# Altium schematic symbol library Schlib.SchLib: 725 symbols (part 4 of 6) (continued)
## MS561101BA03-50
designator U?  (value not drawn)
Pressure Sensor 1.44V to 3.6V 0.01bar to 1.2bar Absolute 8-Pin QFN T/R; Manufacturer: TE Connectivity; Manufacturer Part Number: MS561101BA03-50; Supplier: Rs; Supplier Part Number: 2006121; RoHS: Yes; Category: Pressure Sensors; Stock: 1767; Pricing: 1=7.8, 50=5.05, 100=4.79, 250=4.67, 1000=4.55 (GBP); ComponentLink1URL: http://www.farnell.com/datasheets/2917208.pdf?src-supplier=Farnell; ComponentLink1Description: http://www.farnell.com/datasheets/2917208.pdf?src-supplier=Farnell; ComponentLink2URL: https://datasheet.octopart.com/MS561101BA03-50-TE-Connectivity-datasheet-21074432.pdf?src-supplier=Element14; ComponentLink2Description: https://datasheet.octopart.com/MS561101BA03-50-TE-Connectivity-datasheet-21074432.pdf?src-supplier=Element14; ComponentLink3URL: http://www.farnell.com/datasheets/1756128.pdf?src-supplier=Newark; ComponentLink3Description: http://www.farnell.com/datasheets/1756128.pdf?src-supplier=Newark; ComponentLink4URL: https://www.te.com/commerce/DocumentDelivery/DDEController?Action=srchrtrv&DocNm=MS5611-01BA03&DocType=Data+Sheet&DocLang=English&src-supplier=Digi-Key; ComponentLink4Description: https://www.te.com/commerce/DocumentDelivery/DDEController?Action=srchrtrv&DocNm=MS5611-01BA03&DocType=Data+Sheet&DocLang=English&src-supplier=Digi-Key; ComponentLink5URL: https://datasheet.octopart.com/MS561101BA03-50-TE-Connectivity-datasheet-65793092.pdf?src-supplier=Future+Electronics; ComponentLink5Description: https://datasheet.octopart.com/MS561101BA03-50-TE-Connectivity-datasheet-65793092.pdf?src-supplier=Future+Electronics; ComponentLink6URL: https://datasheet.octopart.com/MS561101BA03-50-TE-Connectivity-datasheet-134530980.pdf?src-supplier=Master+Electronics; ComponentLink6Description: https://datasheet.octopart.com/MS561101BA03-50-TE-Connectivity-datasheet-134530980.pdf?src-supplier=Master+Electronics
footprint MS561101BA03-50
pins: 1 VDD, 2 PS, 3 GND, 4 ~{CSB}, 5 ~{CSB}, 6 SDO, 7 SDI/SDA, 8 SCLK

## MSMP20A-M3/89A
designator D?  (value not drawn)
MSMP Series 0.5 W 24.5 V Uni-Directional Surface Mount TVS Diode - MICRO SMD-2; Manufacturer: Vishay Semiconductors; Manufacturer Part Number: MSMP20A-M3/89A; Number of Unidirectional Channels: 1; Reverse Standoff Voltage: 20V; Min Breakdown Voltage: 22.2V; Clamping Voltage: 32.4V; Peak Pulse Power: 150W; Power Line Protection: No; Peak Pulse Current: 4.6A; Supplier: Digi-Key; Supplier Part Number: MSMP20A-M3/89AGICT-ND; RoHS: Yes; Category: TVS Diodes; Stock: 299775; Pricing: 1=0.37000, 10=0.30200, 100=0.16010, 500=0.10534, 1000=0.07163, 2000=0.06461 (USD); Mounting Technology: Surface Mount; Min Operating Temperature: -55°C; Max Operating Temperature: 150°C; Packaging: Tape and Reel; Resistor Type: Zener; RoHS Compliant: Yes; ComponentLink1URL: http://www.vishay.com/docs/89457/mspm6a.pdf?src-supplier=Digi-Key; ComponentLink1Description: http://www.vishay.com/docs/89457/mspm6a.pdf?src-supplier=Digi-Key
pins: 1, 2

## MSP5.0A-M3/89A
designator D?  (value not drawn)
TVS DIODE 5VWM 13.4VC MICROSMP; Manufacturer: Vishay Semiconductors; Manufacturer Part Number: MSP5.0A-M3/89A; Max Surge Current: 57A; Max Reverse Leakage Current: 100uA; Element Configuration: Single; Direction: Unidirectional; Operating Supply Voltage: 5V; Number of Elements: 1; Reverse Breakdown Voltage: 6.4V; Breakdown Voltage: 7.07V; Clamping Voltage: 14.5V; Peak Pulse Power: 150W; Power Line Protection: No; Test Current: 1mA; Power Dissipation: 100W; ESD Protection: Yes; Peak Pulse Current: 75A; Diode Type: ZENER; Clamping Voltage-Max: 9.2V; Supplier: Digi-Key; Supplier Part Number: MSP5.0A-M3/89AGICT-ND; RoHS: Yes; Category: TVS Diodes; Stock: 310138; Pricing: 1=0.40000, 10=0.33000, 100=0.17520, 500=0.11528, 1000=0.07839, 2000=0.07070 (USD); Mounting Technology: Surface Mount; Pins: 2; Min Operating Temperature: -55°C; Max Operating Temperature: 150°C; Packaging: Tape and Reel; Package Quantity: 1; Series: TransZorb®, eSMP®; Termination: SMD/SMT; Number of Channels: 1; Polarity: Unidirectional; Number of Unidirectional Channels: 1; Reverse Standoff Voltage: 5V; Min Breakdown Voltage: 6.4V; Max Breakdown Voltage: 7.07V; Leakage Current: 100uA; Resistor Type: Zener; Length: 2.3mm; Width: 1.4mm; Height: 0.73mm; Radiation Hardening: No; Lead Free: Lead Free; RoHS Compliant: Yes; ComponentLink1URL: https://datasheet.ciiva.com/3023/msp3v3-3023073.pdf?src-supplier=Avnet; ComponentLink1Description: https://datasheet.ciiva.com/3023/msp3v3-3023073.pdf?src-supplier=Avnet; ComponentLink2URL: https://datasheet.ciiva.com/17019/0900766b80ed1e45-17019980.pdf?src-supplier=Allied+Electronics; ComponentLink2Description: https://datasheet.ciiva.com/17019/0900766b80ed1e45-17019980.pdf?src-supplier=Allied+Electronics; ComponentLink3URL: https://datasheet.ciiva.com/16464/msp3v3-16464165.pdf?src-supplier=Future+Electronics; ComponentLink3Description: https://datasheet.ciiva.com/16464/msp3v3-16464165.pdf?src-supplier=Future+Electronics; ComponentLink4URL: https://datasheet.ciiva.com/330/msp5-0a-330478.pdf?src-supplier=Digi-Key; ComponentLink4Description: https://datasheet.ciiva.com/330/msp5-0a-330478.pdf?src-supplier=Digi-Key; ComponentLink5URL: https://datasheet.ciiva.com/330/msp5-0a-330479.pdf?src-supplier=Digi-Key; ComponentLink5Description: https://datasheet.ciiva.com/330/msp5-0a-330479.pdf?src-supplier=Digi-Key; ComponentLink6URL: https://datasheet.ciiva.com/330/msp5-0a-330477.pdf?src-supplier=Digi-Key; ComponentLink6Description: https://datasheet.ciiva.com/330/msp5-0a-330477.pdf?src-supplier=Digi-Key
footprint microSMP DO-219AD
pins: 1 C, 2 A

## MSS1P4-M3/89A
designator D?  (value not drawn)
Rectifier Diode, Schottky, 1 Phase, 1 Element, 1A, 40V V(RRM), Silicon, DO-219AD; Manufacturer: Vishay Semiconductors; Manufacturer Part Number: MSS1P4-M3/89A; Max Surge Current: 25A; Max Reverse Current: 200uA; Forward Voltage: 550mV; Supplier: Rs; Supplier Part Number: 7103068; RoHS: No; Category: Rectifier Diodes; Stock: 24825; Pricing: 25=0.097, 250=0.058, 1250=0.053, 2500=0.052, 6250=0.05 (EUR); Mounting Technology: Surface Mount; Pins: 2; Min Operating Temperature: -55°C; Max Operating Temperature: 150°C; Forward Current: 1A; Packaging: Tape and Reel; Package Quantity: 4500; Average Rectified Current: 1A; Max Reverse Leakage Current: 200uA; Max Repetitive Reverse Voltage (Vrrm): 40V; Max Forward Surge Current (Ifsm): 25A; Peak Non-Repetitive Surge Current: 25A; Termination: SMD/SMT; Max Reverse Voltage (DC): 40V; Series: eSMP®; Length: 0.09inch; Width: 1.4mm; Height: 0.018inch; Radiation Hardening: No; Lead Free: Lead Free; Reach SVHC Compliant: Unknown; ComponentLink1URL: https://datasheet.ciiva.com/22685/370198-22685680.pdf?src-supplier=Element14; ComponentLink1Description: https://datasheet.ciiva.com/22685/370198-22685680.pdf?src-supplier=Element14
footprint DO-219AD
pins: 1 C, 2 A

## MU00525-32.768K
designator Y?  (value not drawn)
Manufacturer: NDK; Manufacturer Part Number: MU00525-32.768K; Supplier: Digikey; RoHS: No; Stock: 132326; Pricing: 1=0.72, 10=0.601, 50=0.5408, 100=0.4808, 500=0.45672, 1000=0.38461 (USD); Supplier Part Number: 644-MU00525-32.768KCT-ND
pins: 1 OSC1, 2 OSC2

## NC16356SZ
designator Screws?  (value not drawn)
Manufacturer: Keystone Electronics; Manufacturer Part Number: NC16356SZ; Supplier: Mouser; Supplier Part Number: 534-NC16356SZ; RoHS: No; Stock: 5601; Pricing: 1=0.6, 10=0.514, 50=0.514, 100=0.439, 1000=0.362, 10000=0.311 (USD)
text: M1.6,  L-6mm

## NEO-6M-GPS
designator U?
GPS Development Tools SparkFun GNSS-RTK Dead Reckoning Breakout - ZED-F9K (Qwiic); Manufacturer Part Number: NEO-6M-GPS
footprint NEO-6
footprint RFD900
pins: 2 SS_N (in), 3 TIMEPULSE (out), 4 EXTINT0 (in), 5 USB_DM (io), 6 USB_DP (io), 7 VDDUSB (power), 8 RSVD_8, 9 VCC_RF (out), 10 GND (power), 11 RF_IN (in), 12 GND (power), 13 GND (power), 14 MOSI/CFG_COM0 (io), 15 MISO/CFG_COM1 (in), 16 CFG_GPS0/SCK (in), 17 RSVD_17, 18 SDA2 (io), 19 SCL2 (io), 20 TXD1 (out), 21 RXD1 (in), 22 V_BCKP (power), 23 VCC (power), 24 GND (power)

## NEO-M9N-00B
designator U?
series RF Receiver BeiDou, Galileo, GLONASS, GNSS, GPS - -167dBm - - Module; Manufacturer Part Number: NEO-M9N-00B
footprint XCVR_NEO-M9N-00B
pins: 1 SAFEBOOT_N (in), 2 D_SEL (in), 3 TIMEPULSE (out), 4 EXTINT (in), 5 USB_DM (io), 6 USB_DP (io), 7 V_USB (power), 8 RESET_N (in), 9 VCC_RF (power), 10 GND (power), 11 RF_IN (in), 12 GND (power), 13 GND (power), 14 LNA_EN (out), 15 RESERVED, 16 RESERVED, 17 RESERVED, 18 SDA/SPI_CS_N (io), 19 SCL/SPI_CLK (io), 20 TXD/SPI_MISO (out), 21 RXD/SPI_MOSI (in), 22 V_BCKP (power), 23 VCC (power), 24 GND (power)

## NMC0603X5R106M25TRPF
designator *
Cap Ceramic Multilayer 0603 1uF 25VDC 20% T/R - Tape and Reel; Manufacturer: NIC Components; Manufacturer Part Number: NMC0603X5R106M25TRPF; Supplier: Future Electronics; Supplier Part Number: 4113562; RoHS: Yes; Category: Ceramic Capacitors; Pricing: 4000=0.0911, 8000=0.0887, 12000=0.0873, 16000=0.0864, 20000=0.0834 (USD)

## nRF24L01
designator U?
IC RF TxRx Only General ISM > 1GHz - 2.4GHz 20-VFQFN Exposed Pad; Manufacturer Part Number: nRF24L01
footprint QFN50P400X400X95-21N
pins: 1 CE (in), 2 CSN (in), 3 SCK (in), 4 MOSI (in), 5 MISO (out), 6 ~{IRQ} (out), 7 VDD (power), 8 VSS (power), 9 XC2 (out), 10 XC1 (in), 11 VDD_PA (power), 12 ANT1 (io), 13 ANT2 (io), 14 VSS (power), 15 VDD (power), 16 IREF (in), 17 VSS (power), 18 VDD (power), 19 DVDD (power), 20 VSS (power), 21 EP (power)

## NSS1C201LT1G
designator Q?  (value not drawn)
Thick Film Chip Res, 0603, Low Ohmic, 1% / 1%, 240 Milli Ohm, 0603 Case Size, 0.25 W, 300 Ppm; Manufacturer: ON Semiconductor; Manufacturer Part Number: NSS1C201LT1G; Max Power Dissipation: 490mW; Collector Emitter Voltage (VCEO): 100V; Number of Elements: 1; Frequency: 110MHz; Polarity: NPN; Collector Base Voltage (VCBO): 140V; Emitter Base Voltage (VEBO): 7V; Max Collector Current: 3A; Power Dissipation: 710mW; Collector-emitter Voltage-Max: 150mV; hFE Min: 40; Clock Frequency: 100MHz; Value: 240mR; Power Rating: 200mW; Temperature Coefficient: 300ppm/°C; Supplier: Avnet; Supplier Part Number: NSS1C201LT1G; RoHS: Yes; Category: BJTs; Stock: 6000; Pricing: 6000=0.12758, 12000=0.12413, 18000=0.12068, 30000=0.11723, 60000=0.11378, 300000=0.11034, 600000=0.10689 (USD); Case/Package: SOT-23-3; Pins: 3; Min Operating Temperature: -55°C; Max Operating Temperature: 150°C; Package Quantity: 3000; Packaging: Tape and Reel; Collector Emitter Breakdown Voltage: 100V; Transition Frequency: 110MHz; Max Breakdown Voltage: 100V; Gain Bandwidth Product: 110MHz; Series: -; Collector Emitter Saturation Voltage: 150mV; Length: 3.04mm; Width: 2.64mm; Height: 1.11mm; Radiation Hardening: No; Lead Free: Lead Free; RoHS Compliant: Yes; Reach SVHC Compliant: No; Halogen Free: Halogen Free; ComponentLink1URL: https://datasheet.ciiva.com/6356/nss1c201l-d-6356599.pdf?src-supplier=Digikey; ComponentLink1Description: https://datasheet.ciiva.com/6356/nss1c201l-d-6356599.pdf?src-supplier=Digikey; Case Code (Metric): 1608; Case Code (Imperial): 0603; Tolerance: 1%; Resistor Type: Thick Film,Low-Ohm-Resistor; Number of Terminations: 2; Termination: Tab; Features: Automotive AEC-Q200; Resistance Tolerance: 1%; Technology: THICK FILM; Depth: 0.8mm; ComponentLink2URL: https://datasheet.ciiva.com/11818/0900766b80eefa12-11818443.pdf?src-supplier=Rs; ComponentLink2Description: https://datasheet.ciiva.com/11818/0900766b80eefa12-11818443.pdf?src-supplier=Rs; ComponentLink3URL: https://datasheet.ciiva.com/6028/652411-6028455.pdf?src-supplier=Farnell; ComponentLink3Description: https://datasheet.ciiva.com/6028/652411-6028455.pdf?src-supplier=Farnell; ComponentLink4URL: https://datasheet.ciiva.com/6028/652411-6028459.pdf?src-supplier=Farnell; ComponentLink4Description: https://datasheet.ciiva.com/6028/652411-6028459.pdf?src-supplier=Farnell; ComponentLink5URL: https://datasheet.ciiva.com/22706/652411-22706587.pdf?src-supplier=Element14; ComponentLink5Description: https://datasheet.ciiva.com/22706/652411-22706587.pdf?src-supplier=Element14
footprint SOT-23-3
pins: 1 B, 2 E, 3 C

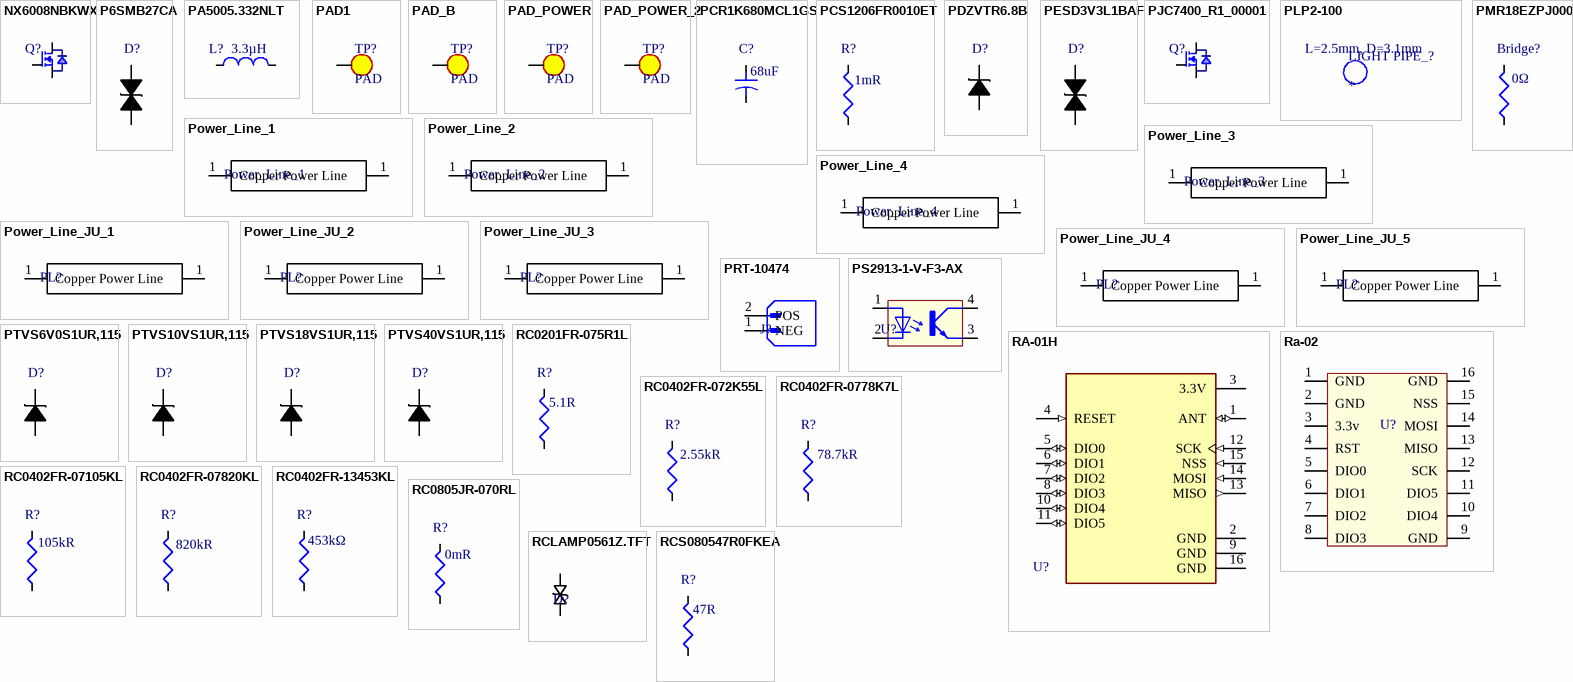
[diagram p15: symbols NX6008NBKWX to RCS080547R0FKEA]

## NX6008NBKWX
designator Q?  (value not drawn)
NX6008NBKW - 60 V, N-channel Trench MOSFET; Manufacturer: Nexperia; Manufacturer Part Number: NX6008NBKWX; Supplier: Digi-Key; Supplier Part Number: 1727-NX6008NBKWXCT-ND; RoHS: No; Category: Uncategorized; Stock: 84909; Pricing: 1=0.23000, 10=0.18600, 100=0.09860, 500=0.06488, 1000=0.04413 (USD); Case/Package: SOT-323, SC-70
footprint SOT-323, SC-70
pins: 1 G, 2 S, 3 D

## P6SMB27CA
designator D?  (value not drawn)
P-Channel 40 V 0.025 Ohm 39 W Surface Mount Power Mosfet - PowerPAK-1212-8; Manufacturer: Littelfuse; Manufacturer Part Number: P6SMB27CA; Supplier: Future Electronics; Supplier Part Number: 7157263; RoHS: Yes; Category: TVS Diodes; Stock: 3000; Pricing: 3000=0.11, 9000=0.106, 12000=0.105, 30000=0.101, 45000=0.098 (USD); ComponentLink1URL: https://datasheet.ciiva.com/18549/littelfuse-tvs-diode-p6smb-datasheet-pdf-18549180.pdf?src-supplier=Digi-Key; ComponentLink1Description: https://datasheet.ciiva.com/18549/littelfuse-tvs-diode-p6smb-datasheet-pdf-18549180.pdf?src-supplier=Digi-Key; ComponentLink2URL: https://datasheet.ciiva.com/331/littelfuse-tvs-diode-p6smb-datasheet-pdf-331721.pdf?src-supplier=Digi-Key; ComponentLink2Description: https://datasheet.ciiva.com/331/littelfuse-tvs-diode-p6smb-datasheet-pdf-331721.pdf?src-supplier=Digi-Key; ComponentLink3URL: https://datasheet.ciiva.com/331/littelfuse-tvs-diode-p6smb-datasheet-pdf-331722.pdf?src-supplier=Digi-Key; ComponentLink3Description: https://datasheet.ciiva.com/331/littelfuse-tvs-diode-p6smb-datasheet-pdf-331722.pdf?src-supplier=Digi-Key; ComponentLink4URL: https://datasheet.ciiva.com/331/littelfuse-tvs-diode-p6smb-datasheet-pdf-331723.pdf?src-supplier=Digi-Key; ComponentLink4Description: https://datasheet.ciiva.com/331/littelfuse-tvs-diode-p6smb-datasheet-pdf-331723.pdf?src-supplier=Digi-Key; ComponentLink5URL: https://datasheet.ciiva.com/4441/si7611dn-244617-4441134.pdf?src-supplier=Mouser; ComponentLink5Description: https://datasheet.ciiva.com/4441/si7611dn-244617-4441134.pdf?src-supplier=Mouser; ComponentLink6URL: https://datasheet.ciiva.com/22652/1719651-22652413.pdf?src-supplier=Element14; ComponentLink6Description: https://datasheet.ciiva.com/22652/1719651-22652413.pdf?src-supplier=Element14; ComponentLink7URL: https://datasheet.ciiva.com/16217/si7611dn-16217425.pdf?src-supplier=Future+Electronics; ComponentLink7Description: https://datasheet.ciiva.com/16217/si7611dn-16217425.pdf?src-supplier=Future+Electronics; ComponentLink8URL: https://datasheet.ciiva.com/22671/si7611dn-22671641.pdf?src-supplier=Element14; ComponentLink8Description: https://datasheet.ciiva.com/22671/si7611dn-22671641.pdf?src-supplier=Element14; ComponentLink9URL: https://datasheet.ciiva.com/933/si7611dn-933572.pdf?src-supplier=Digikey; ComponentLink9Description: https://datasheet.ciiva.com/933/si7611dn-933572.pdf?src-supplier=Digikey; ComponentLink10URL: https://datasheet.ciiva.com/933/si7611dn-933573.pdf?src-supplier=Digikey; ComponentLink10Description: https://datasheet.ciiva.com/933/si7611dn-933573.pdf?src-supplier=Digikey; ComponentLink11URL: https://datasheet.ciiva.com/933/si7611dn-933574.pdf?src-supplier=Digikey; ComponentLink11Description: https://datasheet.ciiva.com/933/si7611dn-933574.pdf?src-supplier=Digikey; ComponentLink12URL: https://datasheet.ciiva.com/11159/si7611dn-11159816.pdf?src-supplier=Avnet; ComponentLink12Description: https://datasheet.ciiva.com/11159/si7611dn-11159816.pdf?src-supplier=Avnet
footprint SC-76, SOD-323
pins: 1, 2

## PA5005.332NLT
designator L?  value 3.3µH  (hidden comment: *)
Inductor Power Shielded/Molded Wirewound 3.3uH 20% 100KHz 11A 0.0125Ohm DCR T/R; Manufacturer: Pulse Electronics; Manufacturer Part Number: PA5005.332NLT; Core Material: Ferrite; DC Resistance (DCR): 12.5mΩ; Number of Circuits: 1; Saturation Current: 10A; Shielding: No; Supplier: DigiKey; Supplier Part Number: 553-4103-1-ND; RoHS: Compliant; Category: Fixed Inductors; Stock: 2067; Pricing: 1=1.74, 10=1.429, 100=1.1747 (USD); Height: 4.8mm; Lifecycle Status: Production; Max Current Rating: 11A; Max Operating Temperature: 155°C; Min Operating Temperature: -55°C; Number of Terminals: 2; REACH SVHC: Yes; RMS Current (Irms): 11A; Schedule B: 8504500000, 8504500000|8504500000|8504500000|8504500000|8504500000; ESR: 12.5mΩ; Test Frequency: 100kHz; Tolerance: 20%; Width: 6.4mm; ComponentLink1URL: https://datasheet.octopart.com:443/PA5005.332NLT-Pulse-datasheet-147572541.pdf?src-supplier=IHS; ComponentLink1Description: https://datasheet.octopart.com:443/PA5005.332NLT-Pulse-datasheet-147572541.pdf?src-supplier=IHS; ComponentLink2URL: https://datasheet.octopart.com:443/PA5005.332NLT-Pulse-datasheet-165531502.pdf?src-supplier=JRH+Electronics; ComponentLink2Description: https://datasheet.octopart.com:443/PA5005.332NLT-Pulse-datasheet-165531502.pdf?src-supplier=JRH+Electronics; ComponentLink3URL: https://datasheet.octopart.com:443/PA5005.332NLT-Pulse-datasheet-182018011.pdf?src-supplier=Future+Electronics; ComponentLink3Description: https://datasheet.octopart.com:443/PA5005.332NLT-Pulse-datasheet-182018011.pdf?src-supplier=Future+Electronics
footprint PA5005.332NLT
pins: 1 B, 2 A

## PAD1
designator TP?, comment PAD
footprint PAD (TestPoint)
pins: 1

## PAD_B
designator TP?, comment PAD
footprint PAD_B (TestPoint)
pins: 1

## PAD_POWER
designator TP?, comment PAD
footprint PAD_POWER (TestPoint)
pins: 1

## PAD_POWER_2
designator TP?, comment PAD
footprint PAD_POWER_2 (TestPoint)
pins: 1

## PCR1K680MCL1GS
designator C?  value 68uF  (hidden comment: *)
PCR Series 68 uF 80 V 125°C 4 kHrs SMT Polymer aluminum Electrolytic Capacitor; Manufacturer: Nichicon; Manufacturer Part Number: PCR1K680MCL1GS; Supplier: Arrow Electronics; Supplier Part Number: PCR1K680MCL1GS; RoHS: Yes; Category: Polymer Capacitors; Stock: 9; Pricing: 1=1.698 (USD); ComponentLink1URL: https://datasheet.ciiva.com/36856/70343009-36856584.pdf?src-supplier=Allied+Electronics; ComponentLink1Description: https://datasheet.ciiva.com/36856/70343009-36856584.pdf?src-supplier=Allied+Electronics
footprint PCR1K680MCL1GS
pins: 1 P, 2 N

## PCS1206FR0010ET
designator R?  value 1mR  (hidden comment: *)
PCS Series 1206 1 W 1 mOhm ±1 % ±50 ppm/°C SMT Low Resistance Chip Resistor; Manufacturer: Ohmite; Manufacturer Part Number: PCS1206FR0010ET; Supplier: Mouser; Supplier Part Number: 588-PCS1206FR0010ET; RoHS: No; Category: Chip SMD Resistors; Stock: 24721; Pricing: 1=0.61, 10=0.447, 50=0.314, 100=0.235, 1000=0.134, 10000=0.132 (USD); Case/Package: 1206
footprint R 1206
pins: 1 B, 2 A

## PDZVTR6.8B
designator D?  (value not drawn)
Zener Diode, 6.8V V(Z), 6.21%, 1W, Silicon, Unidirectional; Manufacturer: ROHM; Manufacturer Part Number: PDZVTR6.8B; Number of Elements: 1; Zener Current: 40mA; Supplier: DigiKey; Supplier Part Number: PDZVTR6.8BCT-ND; RoHS: Compliant; Category: Zener Diodes; Stock: 5177; Pricing: 1=0.43, 10=0.223, 100=0.178, 500=0.152, 1000=0.137 (USD); China RoHS: Non-Compliant; Lifecycle Status: Production; Max Operating Temperature: 150°C; Max Power Dissipation: 1W; Mounting Technology: Surface Mount; Number of Terminals: 2; Polarity: Unidirectional; REACH SVHC: No; Reference Voltage: 6.8V; Voltage Tolerance: 6.21%; ComponentLink1URL: https://datasheet.octopart.com:443/PDZVTR6.8B-ROHM-datasheet-181222031.pdf?src-supplier=IHS; ComponentLink1Description: https://datasheet.octopart.com:443/PDZVTR6.8B-ROHM-datasheet-181222031.pdf?src-supplier=IHS; ComponentLink2URL: https://datasheet.octopart.com:443/PDZVTR6.8B-ROHM-datasheet-181222004.pdf?src-supplier=TME; ComponentLink2Description: https://datasheet.octopart.com:443/PDZVTR6.8B-ROHM-datasheet-181222004.pdf?src-supplier=TME
footprint SOD-128
pins: 1 C, 2 A

## PESD3V3L1BAF
designator D?  (value not drawn)
Trans Voltage Suppressor Diode, 500W, 3.3V V(RWM), Bidirectional, 1 Element, Silicon; Manufacturer: Nexperia; Manufacturer Part Number: PESD3V3L1BAF; Supplier: Digikey; Supplier Part Number: 1727-PESD3V3L1BAFCT-ND; RoHS: Yes; Category: TVS Diodes; Stock: 8571; Pricing: 1=0.28, 10=0.192, 100=0.1, 500=0.0875, 1000=0.075, 2000=0.07, 5000=0.065 (USD); RoHS Compliant: Yes
footprint SC-76, SOD-323
pins: 1, 2

## PJC7400_R1_00001
designator Q?  (value not drawn)
SOT-323, Mosfet; Manufacturer: Pan Jit; Manufacturer Part Number: PJC7400_R1_00001; Supplier 1: Digi-Key; RoHS: Yes; Category: Uncategorized; Stock 1: 198319; Pricing 1: 1=0.44000, 10=0.33400, 100=0.20830, 500=0.14250, 1000=0.10962 (USD); Supplier Part Number 1: 3757-PJC7400_R1_00001CT-ND
footprint SOT-323, SC-70
pins: 1 G, 2 S, 3 D

## PLP2-100
designator LIGHT PIPE_?
LED Light Pipe Round Vertical Clear Rigid Bag; Manufacturer: Bivar; Manufacturer Part Number: PLP2-100; Supplier: Rs; Supplier Part Number: 1749690; RoHS: No; Category: LEDs; Stock: 500; Pricing: 100=0.487, 300=0.433, 500=0.368 (EUR); ComponentLink1URL: http://www.mouser.com/ds/2/50/PLP2-XXX-775789.pdf?src-supplier=Mouser; ComponentLink1Description: http://www.mouser.com/ds/2/50/PLP2-XXX-775789.pdf?src-supplier=Mouser; ComponentLink2URL: https://datasheet.octopart.com/PLP2-100-Bivar-datasheet-78861759.pdf?src-supplier=Future+Electronics; ComponentLink2Description: https://datasheet.octopart.com/PLP2-100-Bivar-datasheet-78861759.pdf?src-supplier=Future+Electronics; ComponentLink3URL: https://www.bivar.com/portals/0/products/PLP2-XXX.pdf?src-supplier=Digikey; ComponentLink3Description: https://www.bivar.com/portals/0/products/PLP2-XXX.pdf?src-supplier=Digikey; ComponentLink4URL: https://datasheet.octopart.com/PLP2-100-Bivar-datasheet-168215188.pdf?src-supplier=TME; ComponentLink4Description: https://datasheet.octopart.com/PLP2-100-Bivar-datasheet-168215188.pdf?src-supplier=TME
footprint PLP2-100
text: L=2.5mm, D=3.1mm

## PMR18EZPJ000
designator Bridge?  value 0Ω  (hidden comment: *)
Res Thick Film 1206 0 Ohm 5% Molded SMD Paper T/R; Manufacturer: ROHM; Manufacturer Part Number: PMR18EZPJ000; Max Current Rating: 38.7A; Temperature Coefficient: 100ppm/°C; Supplier: DigiKey; Supplier Part Number: 846-PMR18EZPJ000CT-ND; RoHS: Compliant; Category: Chip SMD Resistors; Stock: 10789; Pricing: 1=0.77, 10=0.497, 25=0.4236, 50=0.3776, 100=0.3385, 250=0.29548, 500=0.2686, 1000=0.24573 (USD); Case/Package: 1206; Contact Plating: Tin; Height: 320µm; Lifecycle Status: Production; Max Operating Temperature: 155°C; Min Operating Temperature: -55°C; Mounting Technology: Surface Mount; Number of Terminals: 2; REACH SVHC: Yes; Width: 1.6mm; ComponentLink1URL: https://datasheet.octopart.com:443/PMR18EZPJ000-ROHM-datasheet-182147690.pdf?src-supplier=Future+Electronics; ComponentLink1Description: https://datasheet.octopart.com:443/PMR18EZPJ000-ROHM-datasheet-182147690.pdf?src-supplier=Future+Electronics; ComponentLink2URL: https://datasheet.octopart.com:443/PMR18EZPJ000-Rohm-datasheet-115132289.pdf?src-supplier=Future+Electronics; ComponentLink2Description: https://datasheet.octopart.com:443/PMR18EZPJ000-Rohm-datasheet-115132289.pdf?src-supplier=Future+Electronics; ComponentLink3URL: https://datasheet.octopart.com:443/PMR18EZPJ000-Rohm-datasheet-104167456.pdf?src-supplier=Future+Electronics; ComponentLink3Description: https://datasheet.octopart.com:443/PMR18EZPJ000-Rohm-datasheet-104167456.pdf?src-supplier=Future+Electronics; ComponentLink4URL: https://datasheet.octopart.com:443/PMR18EZPJ000-Rohm-datasheet-138897851.pdf?src-supplier=Upverter; ComponentLink4Description: https://datasheet.octopart.com:443/PMR18EZPJ000-Rohm-datasheet-138897851.pdf?src-supplier=Upverter
footprint R 1206
pins: 1 B, 2 A

## Power_Line_1
designator Power_Line_1  (value not drawn)
footprint POWER_LINE_1
pins: 1 Copper Power Line, 1 Copper Power Line

## Power_Line_2
designator Power_Line_2  (value not drawn)
footprint POWER_LINE_2_1
pins: 1 Copper Power Line, 1 Copper Power Line

## Power_Line_3
designator Power_Line_3  (value not drawn)
footprint Power_Line_3
pins: 1 Copper Power Line, 1 Copper Power Line

## Power_Line_4
designator Power_Line_4  (value not drawn)
footprint POWER_LINE_4
pins: 1 Copper Power Line, 1 Copper Power Line

## Power_Line_JU_1
designator PL?  (value not drawn)
Manufacturer Part Number: Power_Line_JU_1
footprint Power_Line_JU_1
pins: 1 Copper Power Line, 1 Copper Power Line

## Power_Line_JU_2
designator PL?  (value not drawn)
Manufacturer Part Number: Power_Line_JU_2
footprint Power_Line_JU_2
pins: 1 Copper Power Line, 1 Copper Power Line

## Power_Line_JU_3
designator PL?  (value not drawn)
Manufacturer Part Number: Power_Line_JU_3
footprint Power_Line_JU_3
pins: 1 Copper Power Line, 1 Copper Power Line

## Power_Line_JU_4
designator PL?  (value not drawn)
Manufacturer Part Number: Power_Line_JU_4
footprint Power_Line_JU_4
pins: 1 Copper Power Line, 1 Copper Power Line

## Power_Line_JU_5
designator PL?  (value not drawn)
Manufacturer Part Number: Power_Line_JU_5
footprint Power_Line_JU_5
pins: 1 Copper Power Line, 1 Copper Power Line

## PRT-10474
designator J?, comment XT-60F  (value not drawn)
Conn DC Power Adapter M/F 2 POS ST 2 Terminal 1 Port; Manufacturer: SparkFun; Manufacturer Part Number: PRT-10474; Number of Contacts: 2; Supplier: Mouser; Supplier Part Number: 474-PRT-10474; RoHS: No; Category: Headers and Wire Housings; Stock: 2466; Pricing: 1=1.5, 10=1.5, 50=1.5, 100=1.5, 1000=1.5, 10000=1.5 (USD); Series: -; Number of Rows: 1; ComponentLink1URL: https://cdn.sparkfun.com/datasheets/Prototyping/xt60.pdf?src-supplier=Digikey; ComponentLink1Description: https://cdn.sparkfun.com/datasheets/Prototyping/xt60.pdf?src-supplier=Digikey
footprint PRT-10474 (Footprint not found)
pins: 1 NEG, 2 POS

## PS2913-1-V-F3-AX
designator U?  (value not drawn)
SINGLE Tr. Output, High Collector to Emitter Voltage 4-PIN Ultra Samll Flat-lead Photocoupler; Manufacturer: Renesas; Manufacturer Part Number: PS2913-1-V-F3-AX; Supplier: Mouser; Supplier Part Number: 968-PS2913-1-V-F3-AX; RoHS: Yes; Category: Optocouplers; Stock: 2390; Pricing: 1=2.27, 10=1.52, 50=1.52, 100=1.17, 1000=0.907, 10000=0.854 (USD); ComponentLink1URL: https://www.renesas.com/us/en/doc/products/opt/r08ds0113ej0201-PS2913-1.pdf?src-supplier=Digi-Key; ComponentLink1Description: https://www.renesas.com/us/en/doc/products/opt/r08ds0113ej0201-PS2913-1.pdf?src-supplier=Digi-Key
pins: 1 A, 2 C, 3 E, 4 CO

## PTVS6V0S1UR,115
designator D?  (value not drawn)
PTVS Series 400 W 10.3 V Unidirectional Surface Mount TVS Diode - SOD123W; Manufacturer: Nexperia; Manufacturer Part Number: PTVS6V0S1UR,115; Min Breakdown Voltage: 6.67V; Peak Pulse Current: 38.3A; Peak Pulse Power: 400W; Reverse Standoff Voltage: 6V; Clamping Voltage: 10.3V; Test Current: 10mA; Polarity: 210Direction; Max Breakdown Voltage: 7.37V; Max Reverse Leakage Current: 400uA; Number of Unidirectional Channels: 1NUMBER; Power Line Protection: 5898YesNo; Element Configuration: 5460ElementConfiguration; Max Surge Current: 38.8A; Supplier: Farnell; Supplier Part Number: 1829265; RoHS: Yes; Category: TVS Diodes; Stock: 5990; Pricing: 5=0.332, 50=0.208, 100=0.165, 500=0.136, 1500=0.117 (EUR); Mounting Technology: 8Mount; Pins: 2NUMBER; Contact Plating: 154ConductorMaterial; Min Operating Temperature: -55°C; Max Operating Temperature: 150°C; Packaging: 13Packaging; Direction: 210Direction; ESD Protection: 5898YesNo; Number of Channels: 1NUMBER; Number of Elements: 1NUMBER; Operating Supply Voltage: 6V; Reverse Breakdown Voltage: 6.67V; Termination: 4890ConnectorType; Leakage Current: 400uA; Radiation Hardening: 5898YesNo; Lead Free: 5697LeadFree; RoHS Compliant: Yes; ComponentLink1URL: https://assets.nexperia.com/documents/data-sheet/PTVSXS1UR_SER.pdf?src-supplier=Digikey; ComponentLink1Description: https://assets.nexperia.com/documents/data-sheet/PTVSXS1UR_SER.pdf?src-supplier=Digikey; ComponentLink2URL: http://www.farnell.com/datasheets/1670937.pdf?src-supplier=Element14; ComponentLink2Description: http://www.farnell.com/datasheets/1670937.pdf?src-supplier=Element14; ComponentLink3URL: https://datasheet.octopart.com/PTVS6V0S1UR%2C115-Nexperia-datasheet-86798298.pdf?src-supplier=Newark; ComponentLink3Description: https://datasheet.octopart.com/PTVS6V0S1UR%2C115-Nexperia-datasheet-86798298.pdf?src-supplier=Newark; ComponentLink4URL: https://datasheet.octopart.com/PTVS6V0S1UR%2C115-Nexperia-datasheet-103604991.pdf?src-supplier=TME; ComponentLink4Description: https://datasheet.octopart.com/PTVS6V0S1UR%2C115-Nexperia-datasheet-103604991.pdf?src-supplier=TME
footprint sod-123w
pins: 1 C, 2 A

## PTVS10VS1UR,115
designator D?  (value not drawn)
SOD-123W Automotive AEC-Q101 1 Surface Mount Zener Tvs Diode 11.1V 2.5muA 400W -55C~150C TA; Manufacturer: Nexperia; Manufacturer Part Number: PTVS10VS1UR,115; Max Reverse Leakage Current: 2.5uA; Peak Pulse Current: 23.5A; Reverse Standoff Voltage: 10V; Direction: 210Direction; Clamping Voltage: 17V; Element Configuration: 5460ElementConfiguration; Test Current: 1mA; Max Breakdown Voltage: 12.3V; Number of Channels: 1NUMBER; Power Line Protection: 5898YesNo; Supplier: Farnell; Supplier Part Number: 1829235; RoHS: Yes; Category: TVS Diodes; Stock: 1321; Pricing: 5=0.372, 50=0.252, 100=0.171, 500=0.133, 1500=0.118 (EUR); Mounting Technology: 8Mount; Pins: 2NUMBER; Min Operating Temperature: -55°C; Max Operating Temperature: 150°C; Min Breakdown Voltage: 11.1V; Peak Pulse Power: 400W; Polarity: 210Direction; Max Surge Current: 23.5A; Number of Elements: 1NUMBER; Number of Unidirectional Channels: 1NUMBER; Operating Supply Voltage: 10V; Power Dissipation: 400W; Reverse Breakdown Voltage: 11.1V; Breakdown Voltage: 11.1V; Leakage Current: 2.5uA; Termination: 4890ConnectorType; Max Power Dissipation: 400W; Packaging: 13Packaging; Radiation Hardening: 5898YesNo; RoHS Compliant: Yes; Lead Free: 5697LeadFree; Reach SVHC Compliant: 4186SVHC; ComponentLink1URL: http://www.farnell.com/datasheets/1670937.pdf?src-supplier=Farnell; ComponentLink1Description: http://www.farnell.com/datasheets/1670937.pdf?src-supplier=Farnell; ComponentLink2URL: https://datasheet.octopart.com/PTVS10VS1UR%2C115-Nexperia-datasheet-86798298.pdf?src-supplier=Future+Electronics; ComponentLink2Description: https://datasheet.octopart.com/PTVS10VS1UR%2C115-Nexperia-datasheet-86798298.pdf?src-supplier=Future+Electronics; ComponentLink3URL: https://datasheet.octopart.com/PTVS10VS1UR%2C115-Nexperia-datasheet-103604991.pdf?src-supplier=TME; ComponentLink3Description: https://datasheet.octopart.com/PTVS10VS1UR%2C115-Nexperia-datasheet-103604991.pdf?src-supplier=TME
footprint sod-123w
pins: 1 C, 2 A

## PTVS18VS1UR,115
designator D?  (value not drawn)
Diode TVS Single Uni-Dir 18V 400W Automotive 2-Pin SOD-123W T/R; Manufacturer: Nexperia; Manufacturer Part Number: PTVS18VS1UR,115; Breakdown Voltage: 20V; Leakage Current: 100nA; Number of Channels: 1NUMBER; Polarity: 210Direction; Peak Pulse Current: 13.7A; Power Line Protection: 5898YesNo; Test Current: 1mA; Clamping Voltage: 29.2V; Element Configuration: 5460ElementConfiguration; Max Breakdown Voltage: 22.1V; Supplier: Farnell; Supplier Part Number: 1829243; RoHS: Yes; Category: TVS Diodes; Stock: 19045; Pricing: 5=0.204, 50=0.168, 100=0.124, 500=0.107, 1500=0.0934 (EUR); Mounting Technology: 8Mount; Pins: 2NUMBER; Min Operating Temperature: -55°C; Max Operating Temperature: 150°C; Termination: 4890ConnectorType; Max Power Dissipation: 400W; Operating Supply Voltage: 18V; Packaging: 13Packaging; Peak Pulse Power: 400W; Power Dissipation: 400W; Reverse Breakdown Voltage: 20V; Reverse Standoff Voltage: 18V; Direction: 210Direction; Max Reverse Leakage Current: 100nA; Max Surge Current: 13.7A; Min Breakdown Voltage: 20V; Number of Elements: 1NUMBER; Number of Unidirectional Channels: 1NUMBER; Radiation Hardening: 5898YesNo; Lead Free: 5697LeadFree; Reach SVHC Compliant: 4186SVHC; ComponentLink1URL: https://datasheet.octopart.com/PTVS18VS1UR%2C115-Nexperia-datasheet-86798298.pdf?src-supplier=Future+Electronics; ComponentLink1Description: https://datasheet.octopart.com/PTVS18VS1UR%2C115-Nexperia-datasheet-86798298.pdf?src-supplier=Future+Electronics; ComponentLink2URL: https://datasheet.octopart.com/PTVS18VS1UR%2C115-Nexperia-datasheet-103604991.pdf?src-supplier=TME; ComponentLink2Description: https://datasheet.octopart.com/PTVS18VS1UR%2C115-Nexperia-datasheet-103604991.pdf?src-supplier=TME
footprint SOD-123W
pins: 1 C, 2 A

## PTVS40VS1UR,115
designator D?  (value not drawn)
PTVS Series 400 W 40 V Uni Directional Surface Mount TVS Diode - SOD-123W; Manufacturer: Nexperia; Manufacturer Part Number: PTVS40VS1UR,115; Breakdown Voltage: 46.8V; Clamping Voltage: 64.5V; Direction: 210Direction; Element Configuration: 5460ElementConfiguration; ESD Protection: 5898YesNo; Leakage Current: 100nA; Max Breakdown Voltage: 49.1V; Max Power Dissipation: 400W; Min Breakdown Voltage: 44.4V; Number of Channels: 1NUMBER; Operating Supply Voltage: 40V; Peak Pulse Current: 6.2A; Test Current: 1mA; Supplier: Farnell; Supplier Part Number: 1829254; RoHS: Yes; Category: TVS Diodes; Stock: 1675; Pricing: 5=0.191, 10=0.125, 100=0.121, 500=0.102, 1000=0.0915, 5000=0.081 (EUR); Mounting Technology: 8Mount; Pins: 2NUMBER; Contact Plating: 154ConductorMaterial; Min Operating Temperature: -55°C; Max Operating Temperature: 150°C; Termination: 4890ConnectorType; Polarity: 210Direction; Max Reverse Leakage Current: 100nA; Number of Elements: 1NUMBER; Number of Unidirectional Channels: 1NUMBER; Peak Pulse Power: 400W; Power Dissipation: 400W; Power Line Protection: 5898YesNo; Reverse Breakdown Voltage: 44.4V; Reverse Standoff Voltage: 40V; Max Surge Current: 6.2A; Height: 1.1mm; Radiation Hardening: 5898YesNo; RoHS Compliant: Yes; Lead Free: 5697LeadFree; Reach SVHC Compliant: 4186SVHC; ComponentLink1URL: https://assets.nexperia.com/documents/data-sheet/PTVSXS1UR_SER.pdf?src-supplier=Digikey; ComponentLink1Description: https://assets.nexperia.com/documents/data-sheet/PTVSXS1UR_SER.pdf?src-supplier=Digikey; ComponentLink2URL: https://datasheet.octopart.com/PTVS40VS1UR%2C115-Nexperia-datasheet-8815263.pdf?src-supplier=Future+Electronics; ComponentLink2Description: https://datasheet.octopart.com/PTVS40VS1UR%2C115-Nexperia-datasheet-8815263.pdf?src-supplier=Future+Electronics; ComponentLink3URL: https://datasheet.octopart.com/PTVS40VS1UR%2C115-Nexperia-datasheet-103604991.pdf?src-supplier=TME; ComponentLink3Description: https://datasheet.octopart.com/PTVS40VS1UR%2C115-Nexperia-datasheet-103604991.pdf?src-supplier=TME
footprint sod-123w
pins: 1 C, 2 A

## RA-01H
designator U?
MÃ´-Ä‘un thu phÃ¡t LoRaâ„¢ ISM < 1GHz chung KhÃ´ng bao gá»“m Äƒng-ten 803 MHz ~ 930 MHz GiÃ¡ treo bá» máº·t
footprint XCVR_RA-01H
pins: 1 ANT (io), 2 GND (power), 3 3.3V (power), 4 RESET (in), 5 DIO0 (io), 6 DIO1 (io), 7 DIO2 (io), 8 DIO3 (io), 9 GND (power), 10 DIO4 (io), 11 DIO5 (io), 12 SCK (in), 13 MISO (out), 14 MOSI (in), 15 NSS (in), 16 GND (power)

## Ra-02
designator U?  (value not drawn)
LORA RA-02 433MHZ; Manufacturer: Ai-Thinker; Regulator Topology: Positive Fixed; Voltage - Output: 3V; Current - Output: 200mA; Voltage - Dropout (Typical): 0.135V @ 200mA; Number of Regulators: 1; Voltage - Input: Up to 5.5V; Current - Limit (Min): 220mA; Supplier 1: Digi-Key; Manufacturer Part Number: Ra-02; RoHS: RoHS Compliant; Category: Integrated Circuits (ICs); Stock 1: 5107; Pricing 1: 1=1.17, 10=1.03, 25=0.9304, 100=0.814, 250=0.71384, 500=0.63308, 1000=0.50065 (USD); Packaging: Cut Tape (CT); Operating Temperature: -40°C ~ 125°C; Mounting Type: Surface Mount; Package / Case: 4-WFBGA, WLCSP; Supplier Device Package: 4-WLCSP (0.76x0.76); ComponentLink1URL: http://www.analog.com/static/imported-files/data_sheets/ADP151.pdf; ComponentLink1Description: http://www.analog.com/static/imported-files/data_sheets/ADP151.pdf
footprint Ra-02 (Chip Array, Concave, 16-Leads, Pitch 2.00mm,  Body 17.00x16.00mm,  IPC Medium Density)
pins: 1 GND, 2 GND, 3 3.3v, 4 RST, 5 DIO0, 6 DIO1, 7 DIO2, 8 DIO3, 9 GND, 10 DIO4, 11 DIO5, 12 SCK, 13 MISO, 14 MOSI, 15 NSS, 16 GND

## RC0201FR-075R1L
designator R?  value 5.1R  (hidden comment: *)